# Altium schematic symbol library LATTICEPLDS_Library.SchLib: 291 symbols (part 28 of 32) (continued)
## LFXP2-8E-T144/TN144 (continued)
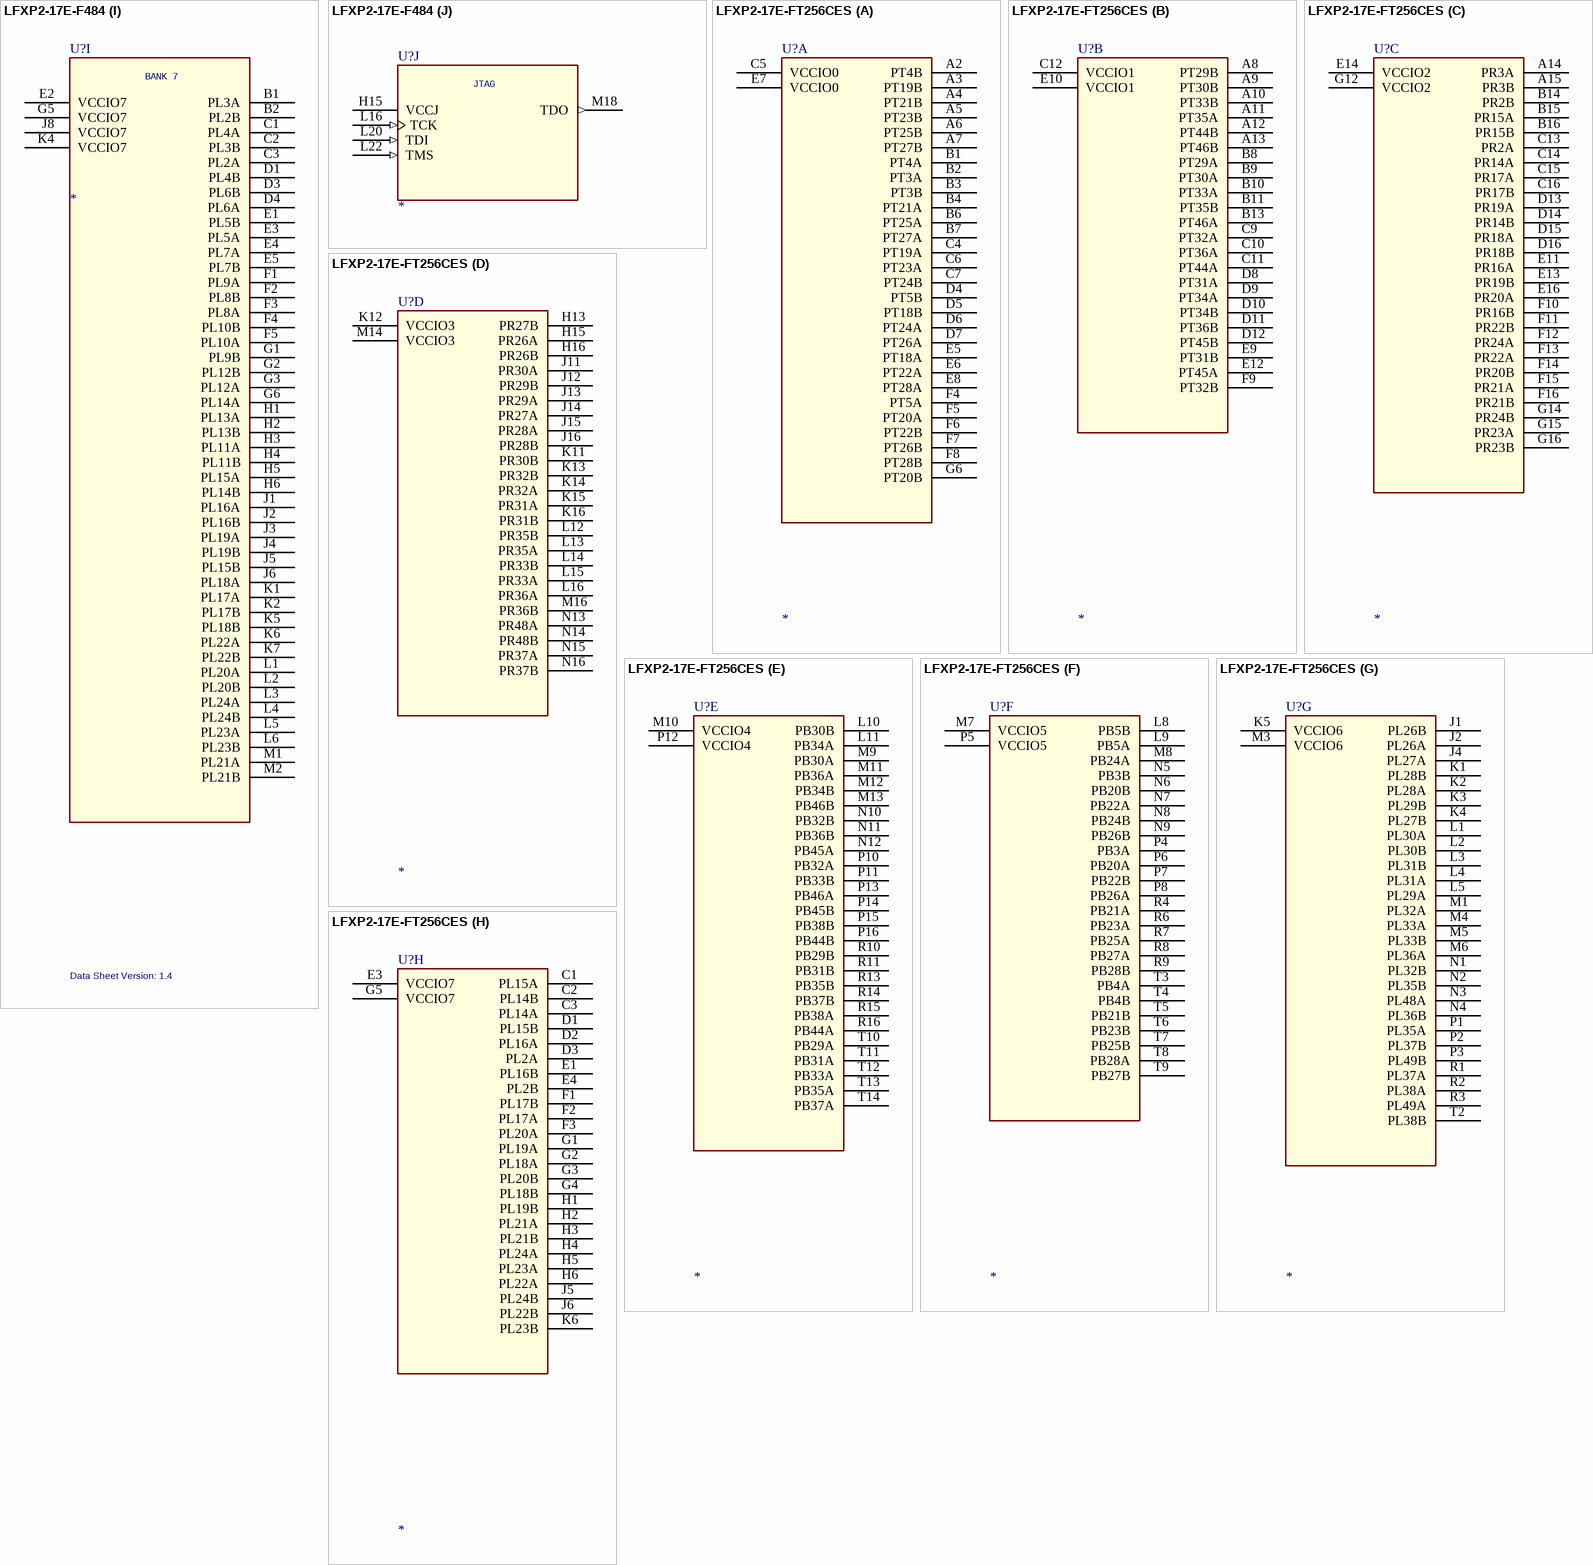
[diagram p256: symbols LFXP2-17E-F484 to LFXP2-17E-FT256CES]
part B text: BANK 1; BANK 0
part C text: BANK 3; BANK 2
part D text: BANK 5; BANK 4
part E text: BANK 7; BANK 6
part F text: JTAG

## LFXP2-17E-F484
designator U?  Data Sheet Version: 1.4
SPLIT_INST: TRUE; SWAP_INFO: (S1+S2+S3+S4+S5+S6+S7+S8+S9+S10)
part A pins: A1 GND (power), A22 GND (power), AA4 GND (power), AA19 GND (power), AB1 GND (power), AB21 NC, AB22 GND (power), B4 GND (power), B19 GND (power), C10 GND (power), C13 GND (power), D2 GND (power), D7 GND (power), D16 GND (power), D21 GND (power), G4 GND (power), G19 GND (power), H8 NC, H10 GND (power), H11 VCCAUX (power), H12 VCCAUX (power), H13 GND (power), J9 GND (power), J10 VCC (power), J11 VCC (power), J12 VCC (power), J13 VCC (power), J14 GND (power), K3 GND (power), K8 GND (power), K9 VCC (power), K10 GND (power), K11 GND (power), K12 GND (power), K13 GND (power), K14 VCC (power), K15 GND (power), K20 GND (power), L7 TOE, L8 VCCAUX (power), L9 VCC (power), L10 GND (power), L11 GND (power), L12 GND (power), L13 GND (power), L14 VCC (power), L15 VCCAUX (power), M8 VCCAUX (power), M9 VCC (power), M10 GND (power), M11 GND (power), M12 GND (power), M13 GND (power), M14 VCC (power), M15 VCCAUX (power), N1 CFG0, N3 GND (power), N8 GND (power), N9 VCC (power), N10 GND (power), N11 GND (power), N12 GND (power), N13 GND (power), N14 VCC (power), N15 GND (power), N20 GND (power), P9 GND (power), P10 VCC (power), P11 VCC (power), P12 VCC (power), P13 VCC (power), P14 GND (power), R8 NC, R10 GND (power), R11 VCCAUX (power), R12 VCCAUX (power), R13 GND (power), R15 NC, T4 GND (power), T19 GND (power), U17 NC, U18 NC, U19 NC, W2 GND (power), W7 GND (power), W16 GND (power), W21 GND (power), Y10 GND (power), Y13 GND (power)
part B pins: A2 PT4A, A3 PT9A, A4 PT9B, A5 PT12A, A6 PT12B, A7 PT16A, A8 PT17A, A9 PT17B, A10 PT21A, A11 PT21B, A12 PT24B, A13 PT25B, A14 PT28B, B3 PT4B, B5 VCCIO0 (power), B6 PT13A, B7 PT13B, B8 PT16B, B9 PT20A, B10 PT20B, B11 PT24A, B12 PT25A, B13 PT28A, C4 PT8B, C5 PT8A, C6 PT10A, C7 PT10B, C8 PT14B, C9 PT18B, C11 PT22B, C12 PT26B, D5 PT6B, D6 PT6A, D8 PT14A, D9 PT18A, D10 VCCIO0 (power), D11 PT22A, E6 PT3B, E7 VCCIO0 (power), E8 PT7B, E9 PT15A, E10 PT19B, E11 PT26A, F6 PT3A, F7 PT5A, F8 PT7A, F9 PT15B, F10 PT19A, F11 PT27A, F12 PT27B, G7 PT5B, G8 PT23A, G9 PT23B, H7 PT11A, H9 VCCIO0 (power), J7 PT11B
part C pins: A15 PT29B, A16 PT32B, A17 PT33B, A18 PT36B, A19 PT42B, A20 PT44A, A21 PT42A, B14 PT29A, B15 PT32A, B16 PT33A, B17 PT36A, B18 VCCIO1 (power), C14 PT34B, C15 PT41A, C16 PT37A, C17 PT37B, C18 PT45A, C19 PT45B, D12 PT30B, D13 VCCIO1 (power), D14 PT38B, D15 PT41B, D17 PT43A, D18 PT43B, D19 PT44B, E12 PT30A, E13 PT34A, E14 PT40A, E15 PT40B, E16 VCCIO1 (power), E17 PT46A, E18 PT46B, F13 PT35A, F14 PT38A, G10 PT31A, G11 PT31B, G12 PT35B, G13 PT39A, G14 PT39B, H14 VCCIO1 (power)
part D pins: B20 PR4A, B21 PR8A, B22 PR12A, C20 PR4B, C21 PR8B, C22 PR12B, D20 PR5B, D22 PR13A, E19 PR10A, E20 PR5A, E21 VCCIO2 (power), E22 PR13B, F15 PR2A, F16 PR2B, F17 PR3B, F18 PR3A, F19 PR10B, F20 PR16A, F21 PR16B, F22 PR17B, G15 PR6A, G16 PR6B, G17 PR7A, G18 VCCIO2 (power), G20 PR9B, G21 PR17A, G22 PR20A, H16 PR14A, H17 PR14B, H18 PR7B, H19 PR11B, H20 PR9A, H21 PR21A, H22 PR20B, J15 VCCIO2 (power), J16 PR22A, J17 PR18A, J18 PR15B, J19 PR15A, J20 PR11A, J21 PR21B, J22 PR24A, K16 PR22B, K17 PR18B, K18 PR19A, K19 VCCIO2 (power), K22 PR24B, L17 PR19B, L18 PR23B, L19 PR23A
part E pins: K21 PR26A, L21 PR26B, M16 PR28B, M17 PR28A, M19 PR27A, M20 PR27B, M21 PR29A, M22 PR30A, N16 PR36B, N17 PR36A, N18 PR31B, N19 VCCIO3 (power), N21 PR29B, N22 PR30B, P15 VCCIO3 (power), P16 PR40A, P17 PR40B, P18 PR31A, P19 PR37A, P20 PR32B, P21 PR32A, P22 PR33A, R16 PR44A, R17 PR41B, R18 PR41A, R19 PR37B, R20 PR35B, R21 PR35A, R22 PR33B, T17 PR44B, T18 VCCIO3 (power), T20 PR38B, T21 PR38A, T22 PR39A, U20 PR43A, U21 PR42A, U22 PR39B, V17 PR48A, V18 PR48B, V19 PR47B, V20 PR43B, V21 VCCIO3 (power), V22 PR42B, W19 PR47A, W20 PR46B, W22 PR46A, Y19 PR45B, Y20 PR45A
part F pins: AA13 PB30B, AA14 PB33A, AA15 PB33B, AA16 PB36A, AA17 PB36B, AA18 VCCIO4 (power), AA20 PB37B, AA21 PB40B, AA22 PB40A, AB16 PB29A, AB17 PB29B, AB18 PB32A, AB19 PB32B, AB20 PB37A, R14 VCCIO4 (power), T14 PB34A, T15 PB34B, T16 PB43A, U12 PB31B, U13 PB35B, U14 PB39A, U15 PB39B, U16 PB43B, V12 PB31A, V13 PB35A, V14 PB38B, V15 PB42B, V16 VCCIO4 (power), W13 VCCIO4 (power), W14 PB38A, W15 PB42A, W17 PB46A, W18 PB46B, Y14 PB30A, Y15 PB44B, Y16 PB44A, Y17 PB45A, Y18 PB45B, Y21 PB41B, Y22 PB41A
part G pins: AA5 VCCIO5 (power), AA6 PB13A, AA7 PB13B, AA8 PB16A, AA9 PB16B, AA10 PB18B, AA11 PB18A, AA12 PB22A, AB2 PB17A, AB3 PB17B, AB4 PB20A, AB5 PB20B, AB6 PB21A, AB7 PB21B, AB8 PB24A, AB9 PB24B, AB10 PB25B, AB11 PB25A, AB12 PB26B, AB13 PB26A, AB14 PB28A, AB15 PB28B, R9 VCCIO5 (power), T8 PB7A, T9 PB7B, T10 PB14A, T11 PB19A, T12 PB23A, T13 PB23B, U6 PB5B, U7 PB3A, U8 PB3B, U9 PB11A, U10 PB11B, U11 PB19B, V6 PB5A, V7 VCCIO5 (power), V8 PB6A, V9 PB12A, V10 PB14B, V11 PB15A, W4 PB4A, W5 PB8A, W6 PB8B, W8 PB6B, W9 PB12B, W10 VCCIO5 (power), W11 PB15B, W12 PB27B, Y5 PB4B, Y6 PB9A, Y7 PB9B, Y8 PB10B, Y9 PB10A, Y11 PB22B, Y12 PB27A
part H pins: AA1 PL35B, AA2 PL38A, AA3 PL47A, M3 PL29A, M4 PL28A, M5 PL28B, M6 PL27A, M7 PL27B, N2 PL29B, N4 VCCIO6 (power), N5 PL31A, N6 PL31B, N7 PL36A, P1 PL26A, P2 PL32A, P3 PL32B, P4 PL37A, P5 PL37B, P6 PL40B, P7 PL36B, P8 VCCIO6 (power), R1 PL26B, R2 PL39A, R3 PL41A, R4 PL41B, R5 PL40A, R6 PL44B, R7 PL44A, T1 PL30A, T2 PL39B, T3 PL46A, T5 VCCIO6 (power), T6 PL48A, T7 PL48B, U1 PL30B, U2 PL43A, U3 PL46B, U4 PL45A, U5 PL45B, V1 PL33A, V2 VCCIO6 (power), V3 PL43B, V4 PL49A, V5 PL49B, W1 PL33B, W3 PL42B, Y1 PL35A, Y2 PL38B, Y3 PL42A, Y4 PL47B
part I pins: B1 PL3A, B2 PL2B, C1 PL4A, C2 PL3B, C3 PL2A, D1 PL4B, D3 PL6B, D4 PL6A, E1 PL5B, E2 VCCIO7 (power), E3 PL5A, E4 PL7A, E5 PL7B, F1 PL9A, F2 PL8B, F3 PL8A, F4 PL10B, F5 PL10A, G1 PL9B, G2 PL12B, G3 PL12A, G5 VCCIO7 (power), G6 PL14A, H1 PL13A, H2 PL13B, H3 PL11A, H4 PL11B, H5 PL15A, H6 PL14B, J1 PL16A, J2 PL16B, J3 PL19A, J4 PL19B, J5 PL15B, J6 PL18A, J8 VCCIO7 (power), K1 PL17A, K2 PL17B, K4 VCCIO7 (power), K5 PL18B, K6 PL22A, K7 PL22B, L1 PL20A, L2 PL20B, L3 PL24A, L4 PL24B, L5 PL23A, L6 PL23B, M1 PL21A, M2 PL21B
part J pins: H15 VCCJ (power), L16 TCK (in), L20 TDI (in), L22 TMS (in), M18 TDO (out)
part A text: SUPPLIES
part B text: BANK 0
part C text: BANK 1
part D text: BANK 2
part E text: BANK 3
part F text: BANK 4
part G text: BANK 5
part H text: BANK 6
part I text: BANK 7
part J text: JTAG

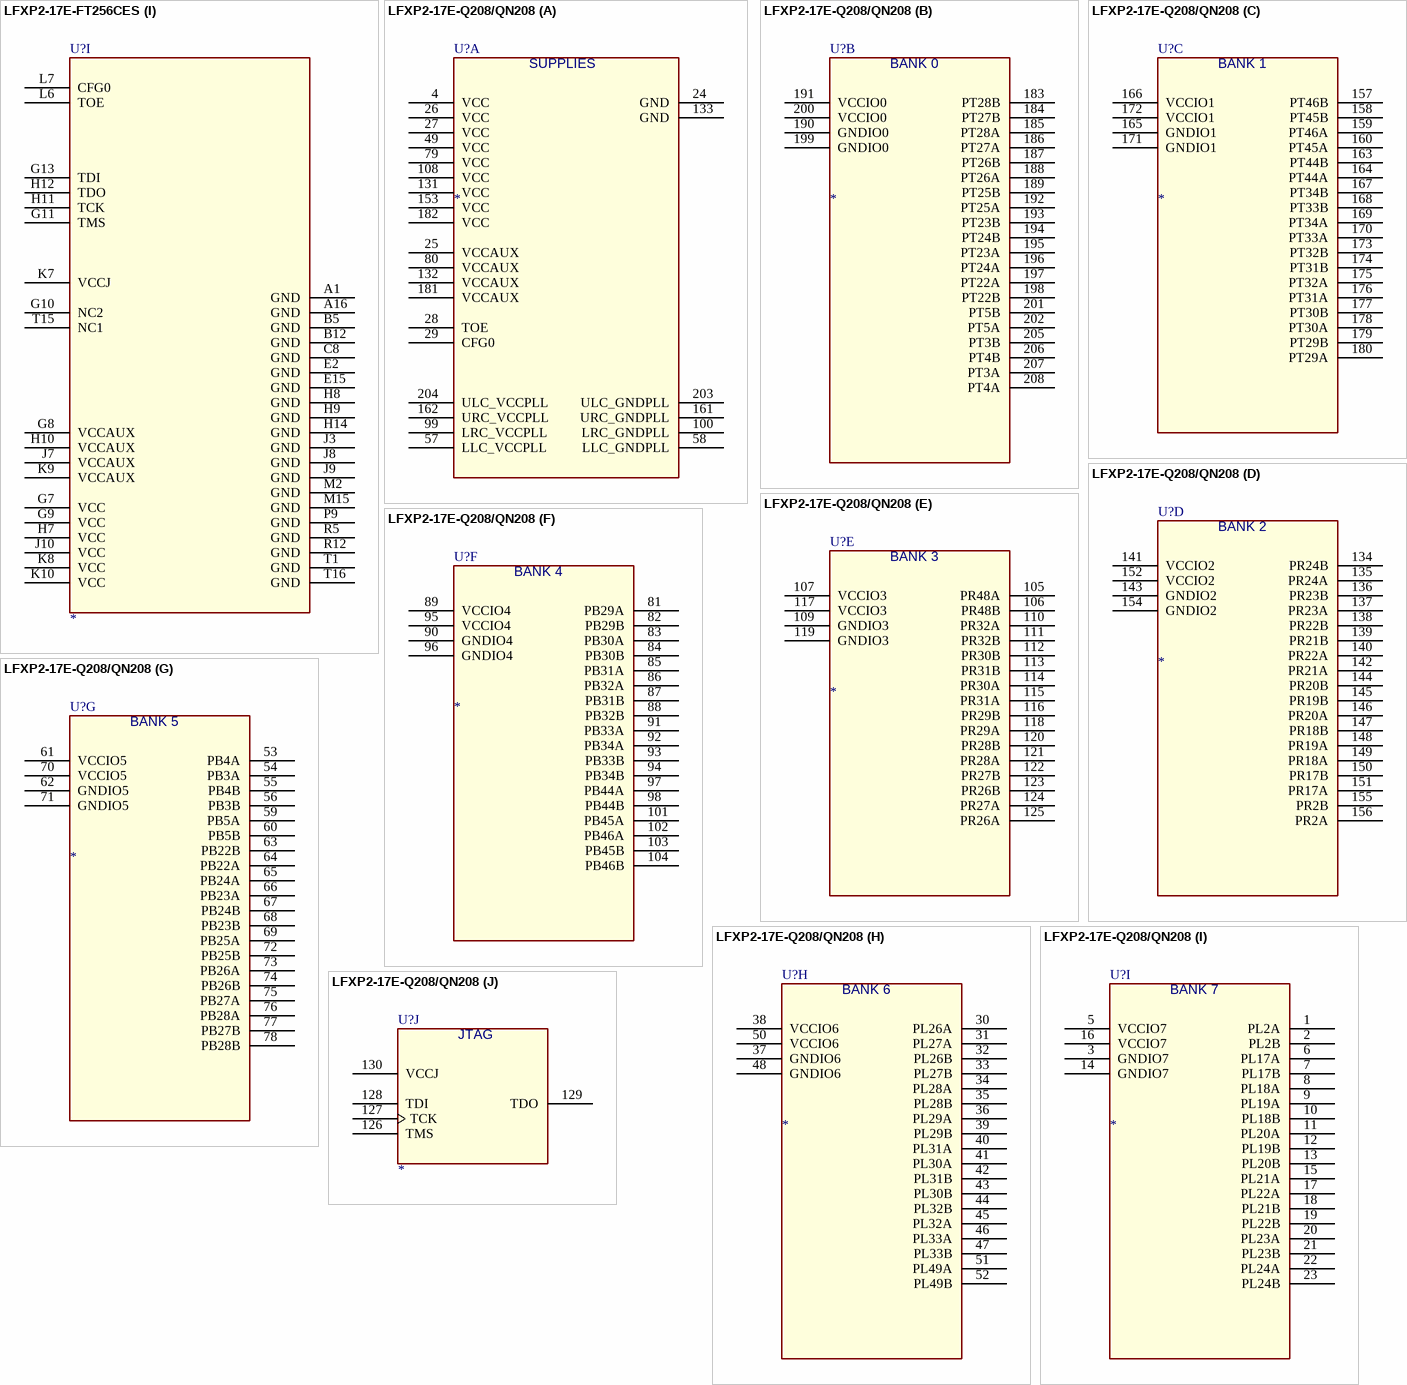
[diagram p257: symbols LFXP2-17E-FT256CES to LFXP2-17E-Q208/QN208]

## LFXP2-17E-FT256CES
designator U?
SPLIT_INST: TRUE; SWAP_INFO: (S1+S2+S3+S4+S5+S6+S7+S8+S9)
part A pins: A2 PT4B, A3 PT19B, A4 PT21B, A5 PT23B, A6 PT25B, A7 PT27B, B1 PT4A, B2 PT3A, B3 PT3B, B4 PT21A, B6 PT25A, B7 PT27A, C4 PT19A, C5 VCCIO0 (power), C6 PT23A, C7 PT24B, D4 PT5B, D5 PT18B, D6 PT24A, D7 PT26A, E5 PT18A, E6 PT22A, E7 VCCIO0 (power), E8 PT28A, F4 PT5A, F5 PT20A, F6 PT22B, F7 PT26B, F8 PT28B, G6 PT20B
part B pins: A8 PT29B, A9 PT30B, A10 PT33B, A11 PT35A, A12 PT44B, A13 PT46B, B8 PT29A, B9 PT30A, B10 PT33A, B11 PT35B, B13 PT46A, C9 PT32A, C10 PT36A, C11 PT44A, C12 VCCIO1 (power), D8 PT31A, D9 PT34A, D10 PT34B, D11 PT36B, D12 PT45B, E9 PT31B, E10 VCCIO1 (power), E12 PT45A, F9 PT32B
part C pins: A14 PR3A, A15 PR3B, B14 PR2B, B15 PR15A, B16 PR15B, C13 PR2A, C14 PR14A, C15 PR17A, C16 PR17B, D13 PR19A, D14 PR14B, D15 PR18A, D16 PR18B, E11 PR16A, E13 PR19B, E14 VCCIO2 (power), E16 PR20A, F10 PR16B, F11 PR22B, F12 PR24A, F13 PR22A, F14 PR20B, F15 PR21A, F16 PR21B, G12 VCCIO2 (power), G14 PR24B, G15 PR23A, G16 PR23B
part D pins: H13 PR27B, H15 PR26A, H16 PR26B, J11 PR30A, J12 PR29B, J13 PR29A, J14 PR27A, J15 PR28A, J16 PR28B, K11 PR30B, K12 VCCIO3 (power), K13 PR32B, K14 PR32A, K15 PR31A, K16 PR31B, L12 PR35B, L13 PR35A, L14 PR33B, L15 PR33A, L16 PR36A, M14 VCCIO3 (power), M16 PR36B, N13 PR48A, N14 PR48B, N15 PR37A, N16 PR37B
part E pins: L10 PB30B, L11 PB34A, M9 PB30A, M10 VCCIO4 (power), M11 PB36A, M12 PB34B, M13 PB46B, N10 PB32B, N11 PB36B, N12 PB45A, P10 PB32A, P11 PB33B, P12 VCCIO4 (power), P13 PB46A, P14 PB45B, P15 PB38B, P16 PB44B, R10 PB29B, R11 PB31B, R13 PB35B, R14 PB37B, R15 PB38A, R16 PB44A, T10 PB29A, T11 PB31A, T12 PB33A, T13 PB35A, T14 PB37A
part F pins: L8 PB5B, L9 PB5A, M7 VCCIO5 (power), M8 PB24A, N5 PB3B, N6 PB20B, N7 PB22A, N8 PB24B, N9 PB26B, P4 PB3A, P5 VCCIO5 (power), P6 PB20A, P7 PB22B, P8 PB26A, R4 PB21A, R6 PB23A, R7 PB25A, R8 PB27A, R9 PB28B, T3 PB4A, T4 PB4B, T5 PB21B, T6 PB23B, T7 PB25B, T8 PB28A, T9 PB27B
part G pins: J1 PL26B, J2 PL26A, J4 PL27A, K1 PL28B, K2 PL28A, K3 PL29B, K4 PL27B, K5 VCCIO6 (power), L1 PL30A, L2 PL30B, L3 PL31B, L4 PL31A, L5 PL29A, M1 PL32A, M3 VCCIO6 (power), M4 PL33A, M5 PL33B, M6 PL36A, N1 PL32B, N2 PL35B, N3 PL48A, N4 PL36B, P1 PL35A, P2 PL37B, P3 PL49B, R1 PL37A, R2 PL38A, R3 PL49A, T2 PL38B
part H pins: C1 PL15A, C2 PL14B, C3 PL14A, D1 PL15B, D2 PL16A, D3 PL2A, E1 PL16B, E3 VCCIO7 (power), E4 PL2B, F1 PL17B, F2 PL17A, F3 PL20A, G1 PL19A, G2 PL18A, G3 PL20B, G4 PL18B, G5 VCCIO7 (power), H1 PL19B, H2 PL21A, H3 PL21B, H4 PL24A, H5 PL23A, H6 PL22A, J5 PL24B, J6 PL22B, K6 PL23B
part I pins: A1 GND (power), A16 GND (power), B5 GND (power), B12 GND (power), C8 GND (power), E2 GND (power), E15 GND (power), G7 VCC (power), G8 VCCAUX (power), G9 VCC (power), G10 NC2, G11 TMS, G13 TDI, H7 VCC (power), H8 GND (power), H9 GND (power), H10 VCCAUX (power), H11 TCK, H12 TDO, H14 GND (power), J3 GND (power), J7 VCCAUX (power), J8 GND (power), J9 GND (power), J10 VCC (power), K7 VCCJ (power), K8 VCC (power), K9 VCCAUX (power), K10 VCC (power), L6 TOE, L7 CFG0, M2 GND (power), M15 GND (power), P9 GND (power), R5 GND (power), R12 GND (power), T1 GND (power), T15 NC1, T16 GND (power)

## LFXP2-17E-Q208/QN208
designator U?
SWAP_INFO: (S1+S2+S3+S4+S5+S6+S7+S8+S9+S10); SPLIT_INST: TRUE
part A pins: 4 VCC (power), 24 GND (power), 25 VCCAUX (power), 26 VCC (power), 27 VCC (power), 28 TOE, 29 CFG0, 49 VCC (power), 57 LLC_VCCPLL (power), 58 LLC_GNDPLL (power), 79 VCC (power), 80 VCCAUX (power), 99 LRC_VCCPLL (power), 100 LRC_GNDPLL (power), 108 VCC (power), 131 VCC (power), 132 VCCAUX (power), 133 GND (power), 153 VCC (power), 161 URC_GNDPLL (power), 162 URC_VCCPLL (power), 181 VCCAUX (power), 182 VCC (power), 203 ULC_GNDPLL (power), 204 ULC_VCCPLL (power)
part B pins: 183 PT28B, 184 PT27B, 185 PT28A, 186 PT27A, 187 PT26B, 188 PT26A, 189 PT25B, 190 GNDIO0 (power), 191 VCCIO0 (power), 192 PT25A, 193 PT23B, 194 PT24B, 195 PT23A, 196 PT24A, 197 PT22A, 198 PT22B, 199 GNDIO0 (power), 200 VCCIO0 (power), 201 PT5B, 202 PT5A, 205 PT3B, 206 PT4B, 207 PT3A, 208 PT4A
part C pins: 157 PT46B, 158 PT45B, 159 PT46A, 160 PT45A, 163 PT44B, 164 PT44A, 165 GNDIO1 (power), 166 VCCIO1 (power), 167 PT34B, 168 PT33B, 169 PT34A, 170 PT33A, 171 GNDIO1 (power), 172 VCCIO1 (power), 173 PT32B, 174 PT31B, 175 PT32A, 176 PT31A, 177 PT30B, 178 PT30A, 179 PT29B, 180 PT29A
part D pins: 134 PR24B, 135 PR24A, 136 PR23B, 137 PR23A, 138 PR22B, 139 PR21B, 140 PR22A, 141 VCCIO2 (power), 142 PR21A, 143 GNDIO2 (power), 144 PR20B, 145 PR19B, 146 PR20A, 147 PR18B, 148 PR19A, 149 PR18A, 150 PR17B, 151 PR17A, 152 VCCIO2 (power), 154 GNDIO2 (power), 155 PR2B, 156 PR2A
part E pins: 105 PR48A, 106 PR48B, 107 VCCIO3 (power), 109 GNDIO3 (power), 110 PR32A, 111 PR32B, 112 PR30B, 113 PR31B, 114 PR30A, 115 PR31A, 116 PR29B, 117 VCCIO3 (power), 118 PR29A, 119 GNDIO3 (power), 120 PR28B, 121 PR28A, 122 PR27B, 123 PR26B, 124 PR27A, 125 PR26A
part F pins: 81 PB29A, 82 PB29B, 83 PB30A, 84 PB30B, 85 PB31A, 86 PB32A, 87 PB31B, 88 PB32B, 89 VCCIO4 (power), 90 GNDIO4 (power), 91 PB33A, 92 PB34A, 93 PB33B, 94 PB34B, 95 VCCIO4 (power), 96 GNDIO4 (power), 97 PB44A, 98 PB44B, 101 PB45A, 102 PB46A, 103 PB45B, 104 PB46B
part G pins: 53 PB4A, 54 PB3A, 55 PB4B, 56 PB3B, 59 PB5A, 60 PB5B, 61 VCCIO5 (power), 62 GNDIO5 (power), 63 PB22B, 64 PB22A, 65 PB24A, 66 PB23A, 67 PB24B, 68 PB23B, 69 PB25A, 70 VCCIO5 (power), 71 GNDIO5 (power), 72 PB25B, 73 PB26A, 74 PB26B, 75 PB27A, 76 PB28A, 77 PB27B, 78 PB28B
part H pins: 30 PL26A, 31 PL27A, 32 PL26B, 33 PL27B, 34 PL28A, 35 PL28B, 36 PL29A, 37 GNDIO6 (power), 38 VCCIO6 (power), 39 PL29B, 40 PL31A, 41 PL30A, 42 PL31B, 43 PL30B, 44 PL32B, 45 PL32A, 46 PL33A, 47 PL33B, 48 GNDIO6 (power), 50 VCCIO6 (power), 51 PL49A, 52 PL49B
part I pins: 1 PL2A, 2 PL2B, 3 GNDIO7 (power), 5 VCCIO7 (power), 6 PL17A, 7 PL17B, 8 PL18A, 9 PL19A, 10 PL18B, 11 PL20A, 12 PL19B, 13 PL20B, 14 GNDIO7 (power), 15 PL21A, 16 VCCIO7 (power), 17 PL22A, 18 PL21B, 19 PL22B, 20 PL23A, 21 PL23B, 22 PL24A, 23 PL24B
part J pins: 126 TMS, 127 TCK, 128 TDI, 129 TDO, 130 VCCJ (power)
part A text: SUPPLIES
part B text: BANK 0
part C text: BANK 1
part D text: BANK 2
part E text: BANK 3
part F text: BANK 4
part G text: BANK 5
part H text: BANK 6
part I text: BANK 7
part J text: JTAG

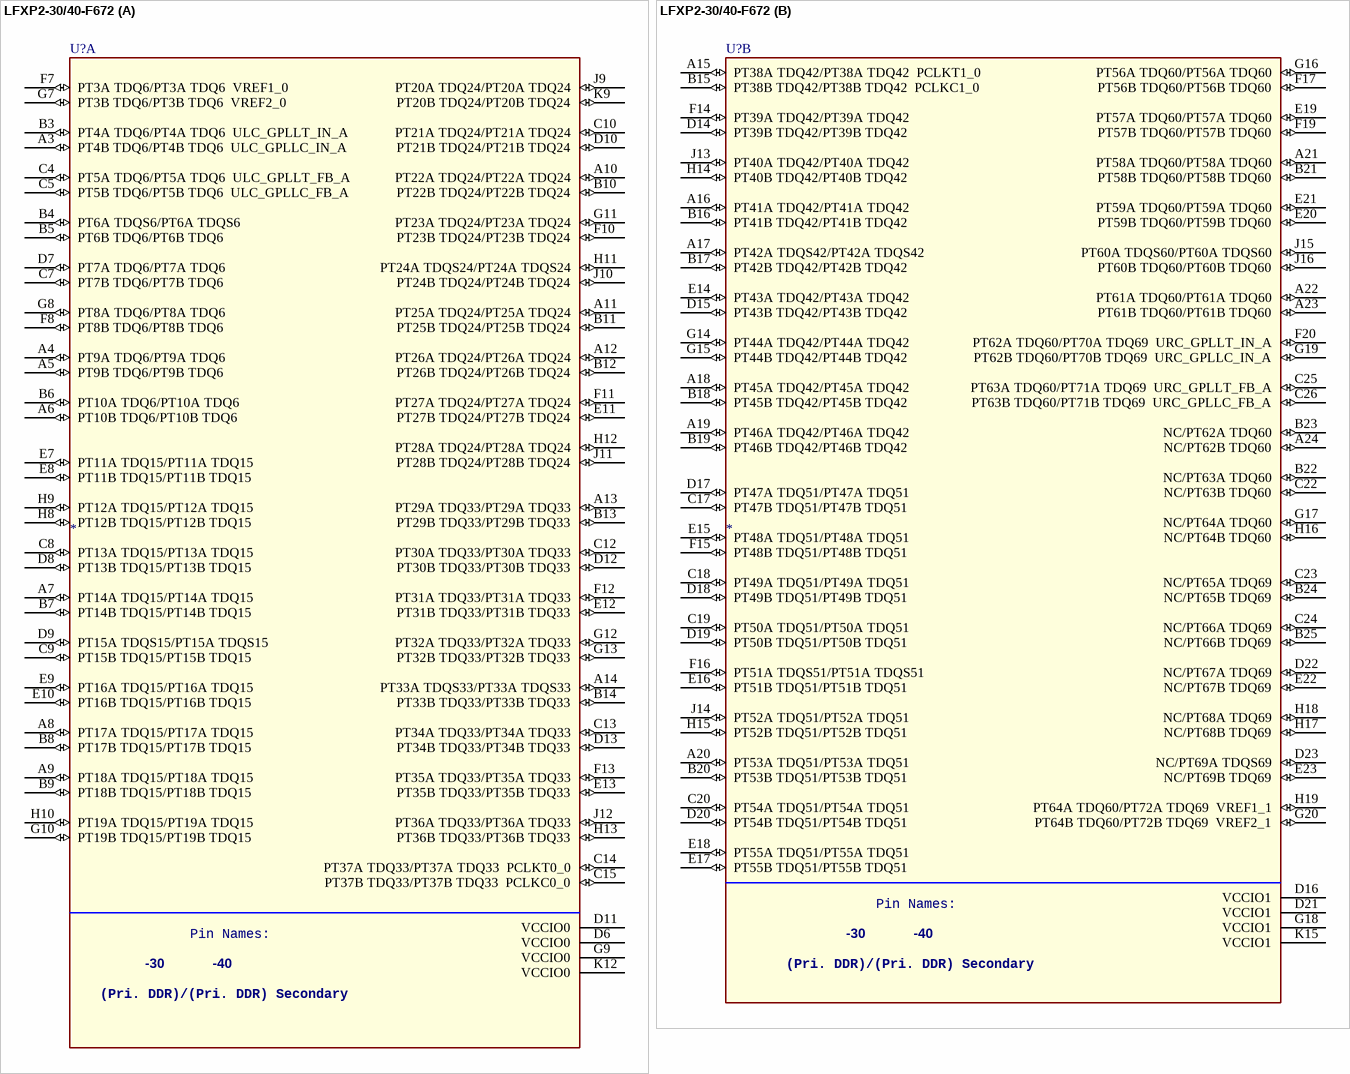
[diagram p258: symbol LFXP2-30/40-F672]

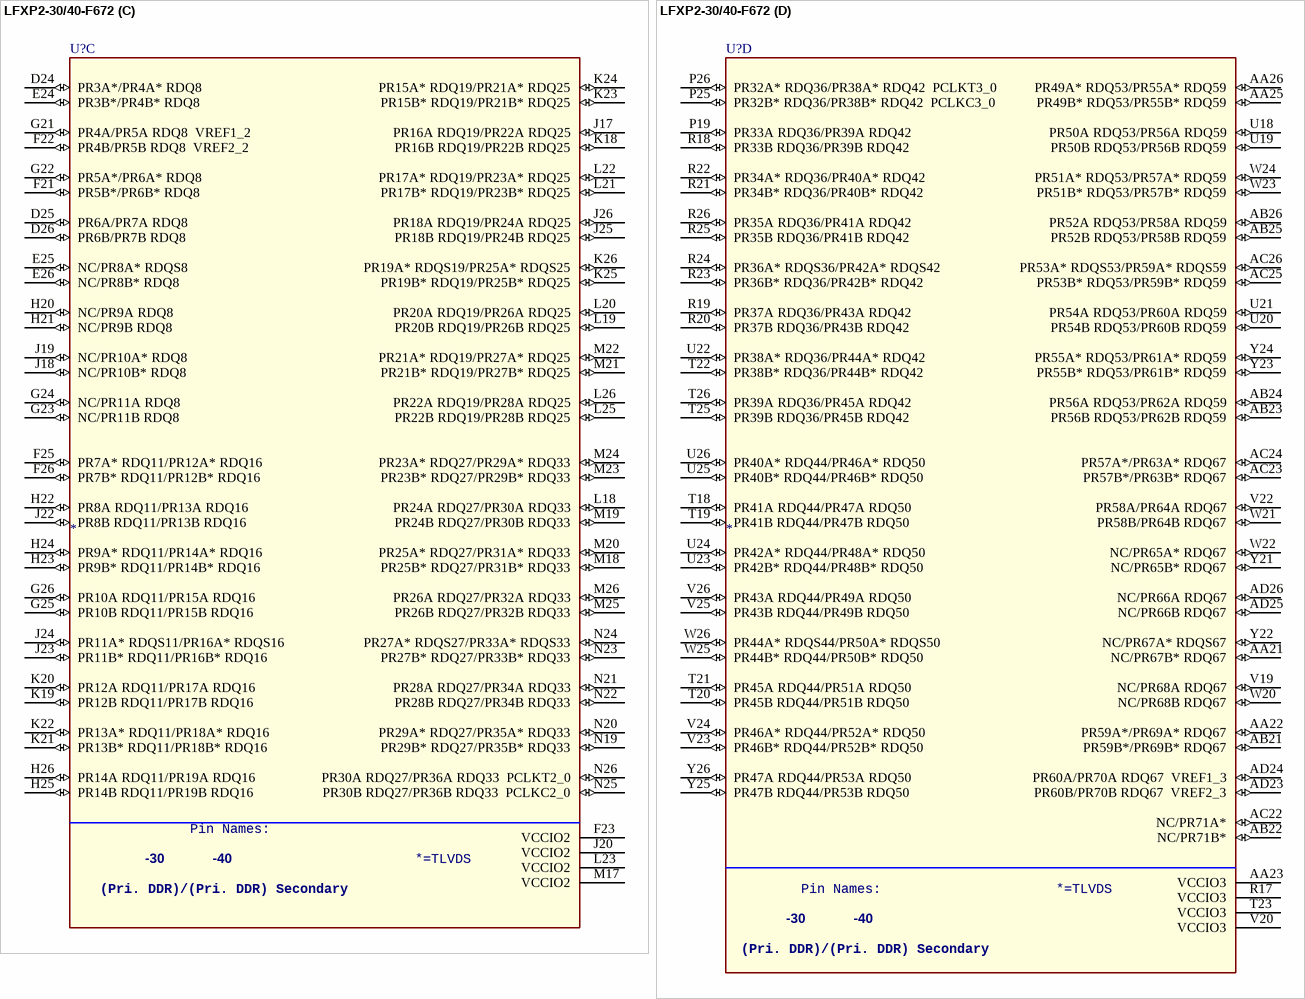
[diagram p259: symbol LFXP2-30/40-F672]

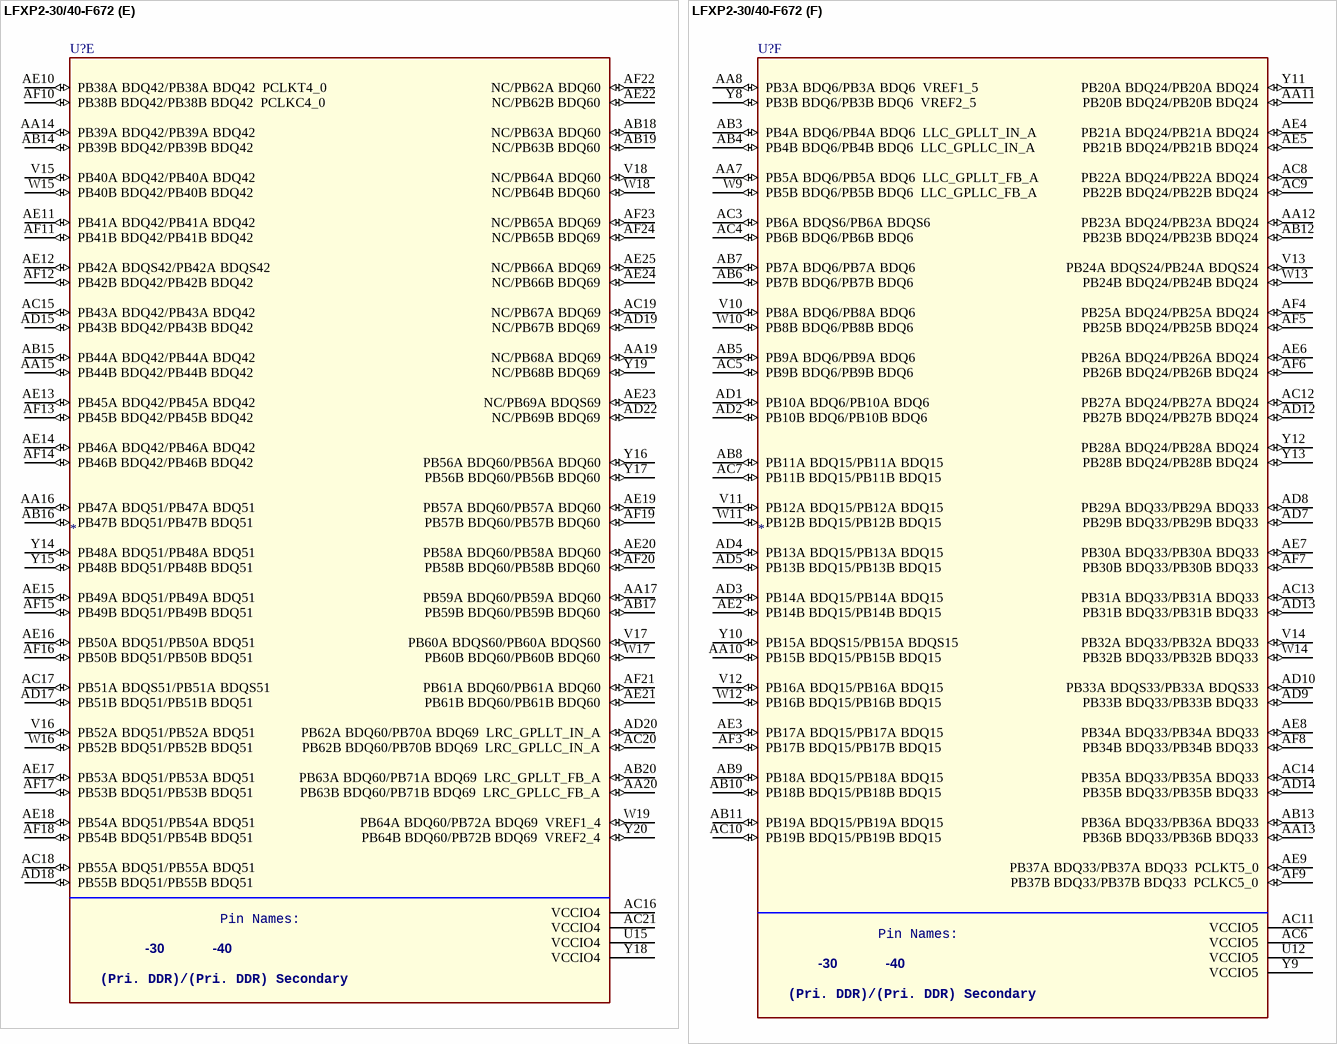
[diagram p260: symbol LFXP2-30/40-F672]

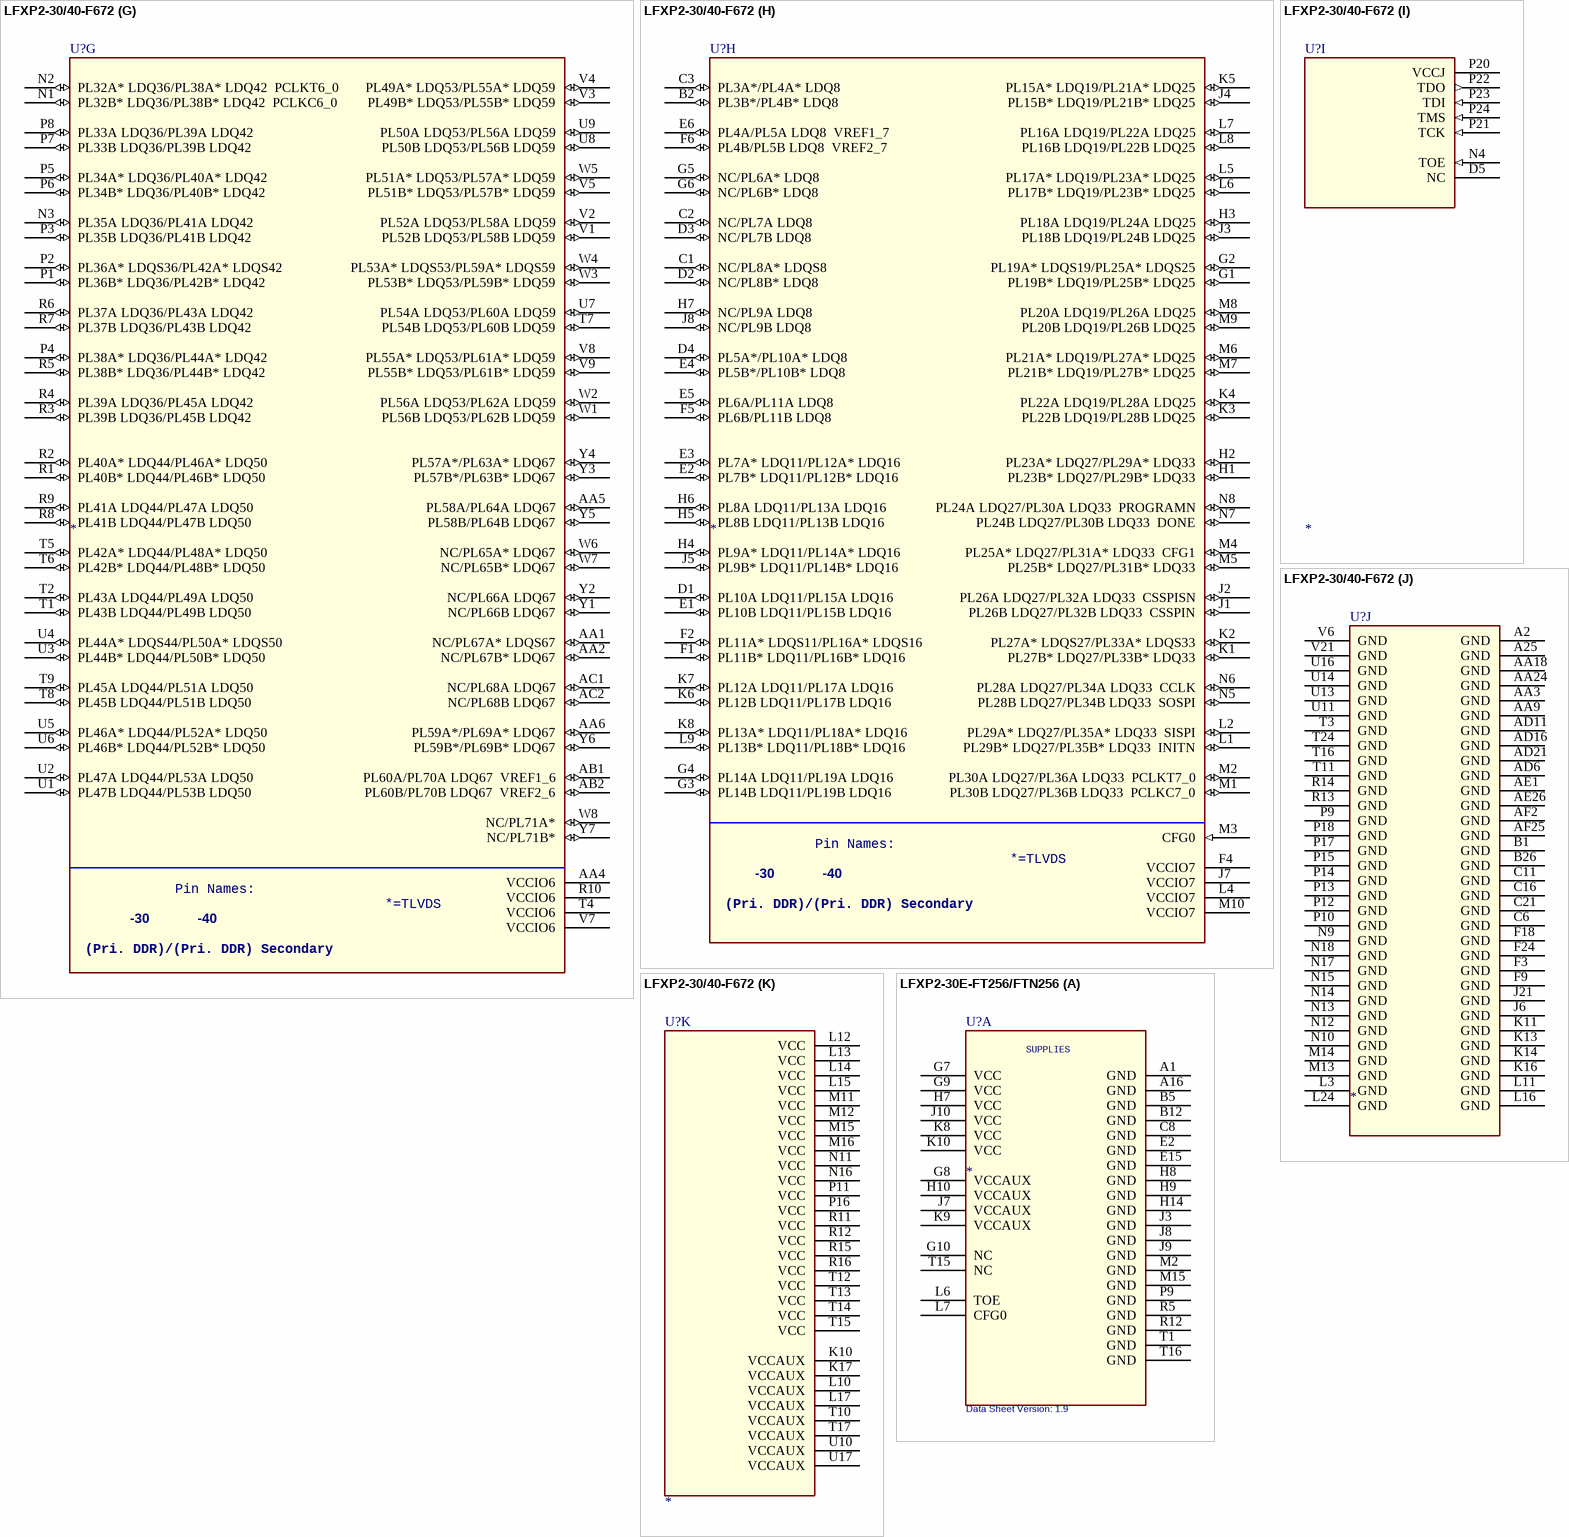
[diagram p261: symbols LFXP2-30/40-F672 to LFXP2-30E-FT256/FTN256]